# Altium footprint library TarabusLibrary.PcbLib: 591 footprints (part 20 of 37)
Each footprint in its own frame and in the unit in brackets; x right, y up, seen from the top. Pads: shape width x height; smd on the part's side, far side on the other; paste and mask are expansions set on the pad; w line width, h text height; cw(c..) or ccw(c..) is an arc to the next point about the centre after c.
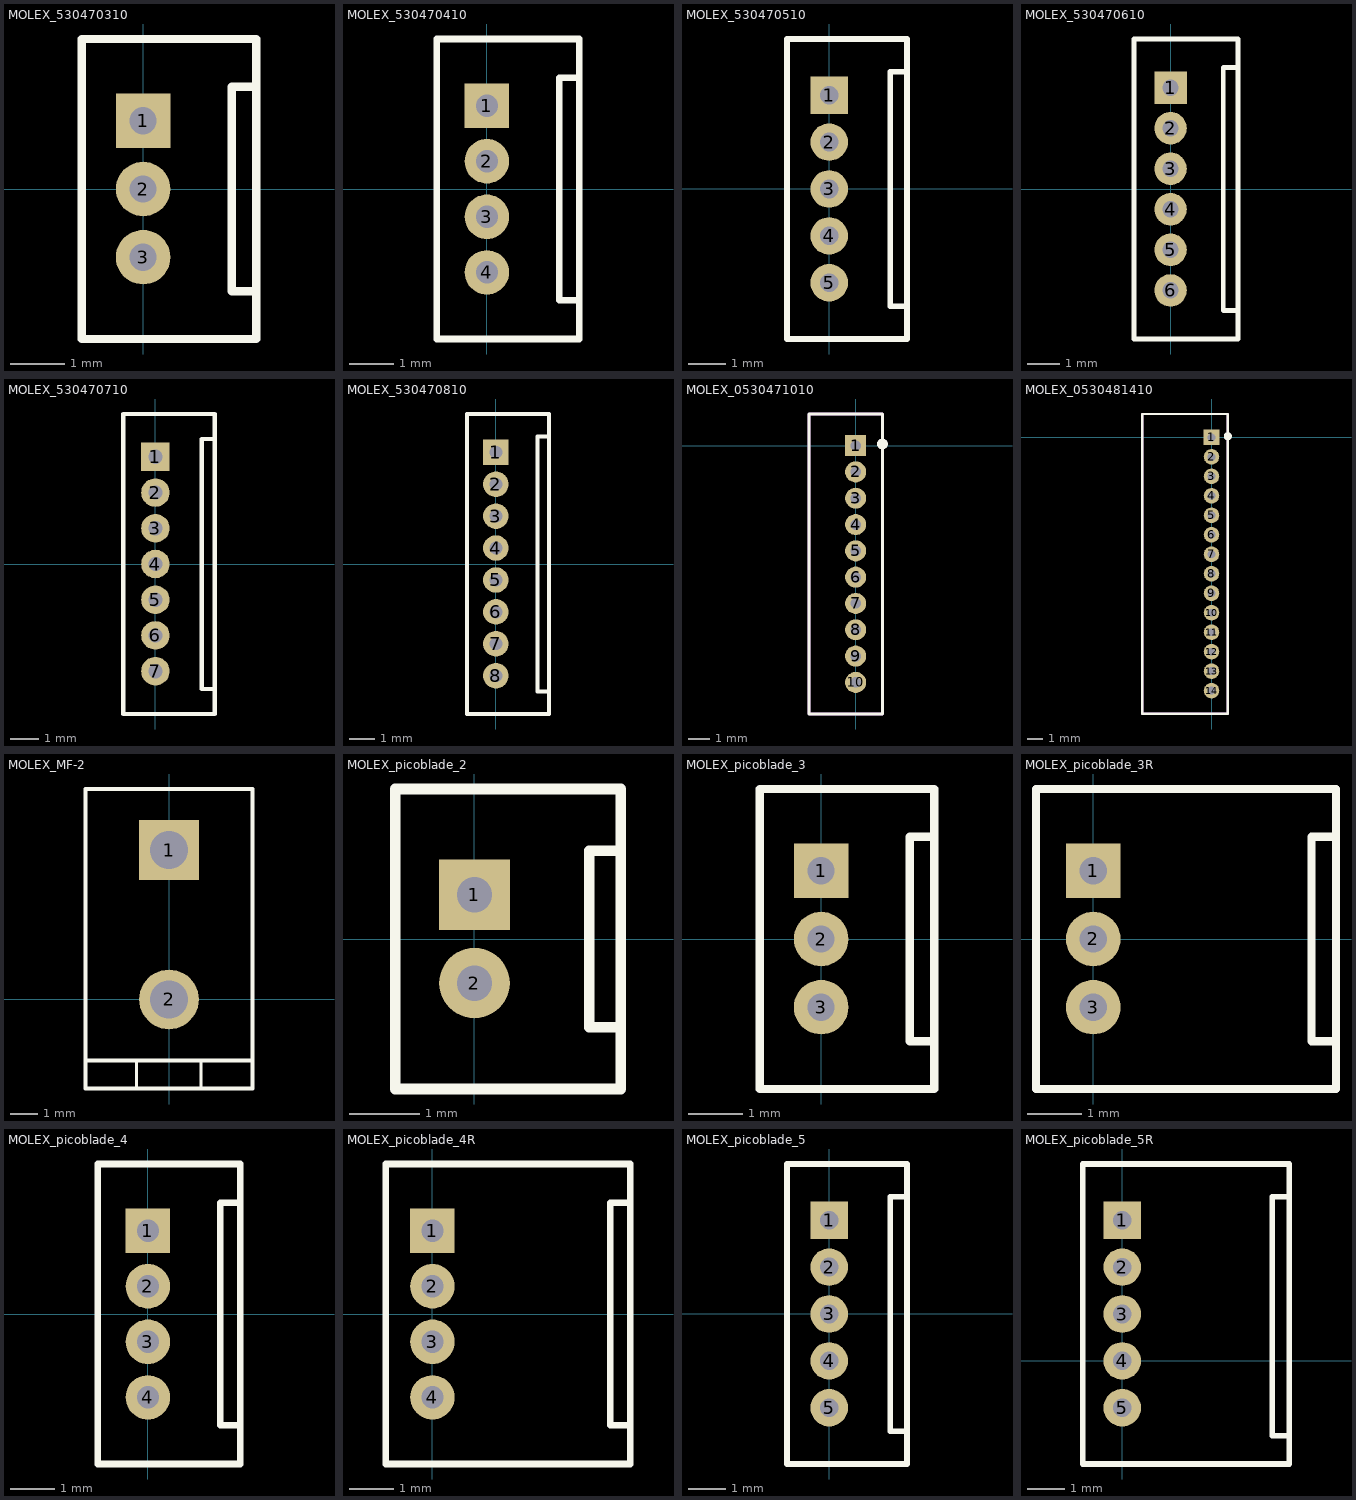
[diagram p19: the footprints below, top view; thin cyan lines are the x and y axes]

## MOLEX_530470310 [mm]
height 4.2
pads (3):
  rect 1x1 hole 0.5 mask+0.15: 1(0,1.25)
  round 1 hole 0.5 mask+0.15: 2(0,0) 3(0,-1.25)
Top Overlay:
  lines w0.15: 2.075,-1.875 1.625,-1.875 1.625,1.875 2.075,1.875 ; -1.125,-2.75 2.075,-2.75 2.075,2.75 -1.125,2.75 -1.125,-2.75
Mechanical 7:
  lines w0.1: 2.075,-1.875 1.625,-1.875 1.625,1.875 2.075,1.875 ; -1.125,-2.75 2.075,-2.75 2.075,2.75 -1.125,2.75 -1.125,-2.75
Mechanical 10:
  text ".Designator" at -0.78,3.68 h0.8
  text ".Comment" at -0.77,3.11 h0.6
3D body "530470310.STEP": height 4.22, standoff -2.18, extent -1.125,-2.75 2.075,2.75

## MOLEX_530470410 [mm]
height 4.2
pads (4):
  rect 1x1 hole 0.5 mask+0.15: 1(0,1.875)
  round 1 hole 0.5 mask+0.15: 2(0,0.625) 3(0,-0.625) 4(0,-1.875)
Top Overlay:
  lines w0.15: 2.075,-2.5 1.625,-2.5 1.625,2.5 2.075,2.5 ; -1.125,-3.375 -1.125,3.375 2.075,3.375 2.075,-3.375 -1.125,-3.375
Mechanical 7:
  lines w0.1: 2.075,-2.5 1.625,-2.5 1.625,2.5 2.075,2.5 ; -1.125,-3.375 -1.125,3.375 2.075,3.375 2.075,-3.375 -1.125,-3.375
Mechanical 10:
  text ".Comment" at -0.77,3.735 h0.6
  text ".Designator" at -0.78,4.305 h0.8
3D body "530470410.STEP": height 4.22, standoff -2.18, extent -1.125,-3.375 2.075,3.375

## MOLEX_530470510 [mm]
height 4.2
pads (5):
  rect 1x1 hole 0.5 mask+0.15: 1(0,2.5)
  round 1 hole 0.5 mask+0.15: 2(0,1.25) 3(0,0) 4(0,-1.25) 5(0,-2.5)
Top Overlay:
  lines w0.15: 2.075,-3.125 1.625,-3.125 1.625,3.125 2.075,3.125 ; -1.125,-4 -1.125,4 2.075,4 2.075,-4 -1.125,-4
Mechanical 7:
  lines w0.1: 2.075,-3.125 1.625,-3.125 1.625,3.125 2.075,3.125 ; -1.125,-4 -1.125,4 2.075,4 2.075,-4 -1.125,-4
Mechanical 10:
  text ".Comment" at -0.77,4.36 h0.6
  text ".Designator" at -0.78,4.93 h0.8
3D body "530470510.STEP": height 4.22, standoff -2.18, extent -1.125,-4 2.075,4

## MOLEX_530470610 [mm]
height 4.2
pads (6):
  rect 1x1 hole 0.5 mask+0.15: 1(0,3.125)
  round 1 hole 0.5 mask+0.15: 2(0,1.875) 3(0,0.625) 4(0,-0.625) 5(0,-1.875) 6(0,-3.125)
Top Overlay:
  lines w0.15: 2.075,-3.75 1.625,-3.75 1.625,3.75 2.075,3.75 ; -1.125,-4.625 -1.125,4.625 2.075,4.625 2.075,-4.625 -1.125,-4.625
Mechanical 7:
  lines w0.1: 2.075,-3.75 1.625,-3.75 1.625,3.75 2.075,3.75 ; -1.125,-4.625 -1.125,4.625 2.075,4.625 2.075,-4.625 -1.125,-4.625
Mechanical 10:
  text ".Comment" at -0.77,4.985 h0.6
  text ".Designator" at -0.78,5.555 h0.8
3D body "530470610.STEP": height 4.22, standoff -2.18, extent -1.125,-4.625 2.075,4.625

## MOLEX_530470710 [mm]
height 4.2
pads (7):
  rect 1x1 hole 0.5 mask+0.15: 1(0,3.75)
  round 1 hole 0.5 mask+0.15: 2(0,2.5) 3(0,1.25) 4(0,0) 5(0,-1.25) 6(0,-2.5) 7(0,-3.75)
Top Overlay:
  lines w0.15: 2.075,-4.375 1.625,-4.375 1.625,4.375 2.075,4.375 ; -1.125,-5.25 -1.125,5.25 2.075,5.25 2.075,-5.25 -1.125,-5.25
Mechanical 7:
  lines w0.1: 2.075,-4.375 1.625,-4.375 1.625,4.375 2.075,4.375 ; -1.125,-5.25 -1.125,5.25 2.075,5.25 2.075,-5.25 -1.125,-5.25
Mechanical 10:
  text ".Comment" at -0.77,5.61 h0.6
  text ".Designator" at -0.78,6.18 h0.8
3D body "530470710.STEP": height 4.22, standoff -2.18, extent -1.125,-5.25 2.075,5.25

## MOLEX_530470810 [mm]
height 4.2
pads (8):
  rect 1x1 hole 0.5 mask+0.15: 1(0,4.375)
  round 1 hole 0.5 mask+0.15: 2(0,3.125) 3(0,1.875) 4(0,0.625) 5(0,-0.625) 6(0,-1.875) 7(0,-3.125) 8(0,-4.375)
Top Overlay:
  lines w0.15: 2.075,-5 1.625,-5 1.625,5 2.075,5 ; -1.125,-5.875 2.075,-5.875 2.075,5.875 -1.125,5.875 -1.125,-5.875
Mechanical 7:
  lines w0.1: 2.075,-5 1.625,-5 1.625,5 2.075,5 ; -1.125,-5.875 2.075,-5.875 2.075,5.875 -1.125,5.875 -1.125,-5.875
Mechanical 10:
  text ".Designator" at -0.78,6.805 h0.8
  text ".Comment" at -0.77,6.235 h0.6
3D body "530470810.STEP": height 4.22, standoff -2.18, extent -1.125,-5.875 2.075,5.875

## MOLEX_0530471010 [mm]
pads (10):
  rect 1x1 hole 0.5 mask+0.15: 1(0,0)
  round 1 hole 0.5 mask+0.15: 2(0,-1.25) 3(0,-2.5) 4(0,-3.75) 5(0,-5) 6(0,-6.25) 7(0,-7.5) 8(0,-8.75) 9(0,-10) 10(0,-11.25)
Top Overlay:
  circle w0.254: c1.273,0.075 r0.127
  lines w0.15: -2.225,-12.75 1.275,-12.75 1.275,1.5 -2.225,1.5 -2.225,-12.75
Mechanical 7:
  lines w0.15: -2.225,-12.75 1.275,-12.75 1.275,1.5 -2.225,1.5 -2.225,-12.75
3D body "User Library-53047-1010.step": height 4.25, standoff -2.25, extent -2.225,-12.75 1.275,1.5

## MOLEX_0530481410 [mm]
pads (14):
  rect 1x1 hole 0.5 mask+0.15: 1(0,0)
  round 1 hole 0.5 mask+0.15: 2(0,-1.25) 3(0,-2.5) 4(0,-3.75) 5(0,-5) 6(0,-6.25) 7(0,-7.5) 8(0,-8.75) 9(0,-10) 10(0,-11.25) 11(0,-12.5) 12(0,-13.75) 13(0,-15) 14(0,-16.25)
Top Overlay:
  circle w0.254: c1.048,0.075 r0.127
  lines w0.15: -4.45,-17.725 -4.45,1.5 1.05,1.5 1.05,-17.75 1.025,-17.725 -4.45,-17.725
Mechanical 7:
  lines w0.15: -4.45,-17.725 1.025,-17.725 1.05,-17.75 1.05,1.5 -4.45,1.5 -4.45,-17.725
3D body "User Library-53048-1410.step": height 3.5, standoff -2.4, extent -4.45,-17.75 1.05,1.5

## MOLEX_MF-2 [mm]
pads (2):
  rect 2.2x2.2 hole 1.4: 1(0,5.5)
  round 2.2 hole 1.4: 2(0,0)
Top Overlay:
  lines w0.1: -1.2,-3.275 -1.2,-2.25 ; 1.175,-3.275 1.175,-2.25 ; 1.2,-3.275 1.225,-3.3
  lines w0.15: -3.075,-2.25 3.075,-2.25 ; -3.075,-3.275 -3.075,7.75 3.075,7.75 3.075,-3.275 -3.075,-3.275
Mechanical 7:
  lines w0.1: -3.075,-2.25 3.075,-2.25 3.075,7.75 -3.075,7.75 -3.075,-2.25
Mechanical 10:
  text ".Comment" at -1.27,4.41 h0.6
  text ".Designator" at -1.28,4.98 h0.8
3D body "039281023.stp": height 12.8, standoff -3.5, extent -3.1,-3.2 3.1,7.8

## MOLEX_picoblade_2 [mm]
height 4.2
pads (2):
  rect 1x1 hole 0.5 mask+0.15: 1(0,0.625)
  round 1 hole 0.5 mask+0.15: 2(0,-0.625)
Top Overlay:
  lines w0.15: 2.075,-1.25 1.625,-1.25 1.625,1.25 2.075,1.25 ; -1.125,-2.125 2.075,-2.125 2.075,2.125 -1.125,2.125 -1.125,-2.125
Mechanical 7:
  lines w0.1: 2.075,-1.25 1.625,-1.25 1.625,1.25 2.075,1.25 ; -1.125,-2.125 -1.125,2.125 2.075,2.125 2.075,-2.125 -1.125,-2.125
Mechanical 10:
  text ".Designator" at -0.78,3.055 h0.8
  text ".Comment" at -0.77,2.485 h0.6
3D body "530470210.STEP": height 4.22, standoff -2.18, extent -1.125,-2.125 2.075,2.125

## MOLEX_picoblade_3 [mm]
height 4.2
pads (3):
  rect 1x1 hole 0.5 mask+0.15: 1(0,1.25)
  round 1 hole 0.5 mask+0.15: 2(0,0) 3(0,-1.25)
Top Overlay:
  lines w0.15: 2.075,-1.875 1.625,-1.875 1.625,1.875 2.075,1.875 ; -1.125,-2.75 2.075,-2.75 2.075,2.75 -1.125,2.75 -1.125,-2.75
Mechanical 7:
  lines w0.1: 2.075,-1.875 1.625,-1.875 1.625,1.875 2.075,1.875 ; -1.125,-2.75 2.075,-2.75 2.075,2.75 -1.125,2.75 -1.125,-2.75
Mechanical 10:
  text ".Designator" at -0.78,3.68 h0.8
  text ".Comment" at -0.77,3.11 h0.6
3D body "530470310.STEP": height 4.22, standoff -2.18, extent -1.125,-2.75 2.075,2.75

## MOLEX_picoblade_3R [mm]
height 3.5
pads (3):
  rect 1x1 hole 0.5 mask+0.15: 1(0,1.25)
  round 1 hole 0.5 mask+0.15: 2(0,0) 3(0,-1.25)
Top Overlay:
  lines w0.15: 4.45,-1.875 4,-1.875 4,1.875 4.45,1.875 ; -1.05,-2.75 -1.05,2.75 4.45,2.75 4.45,-2.75 -1.05,-2.75
Mechanical 7:
  lines w0.1: 4.45,-1.875 4,-1.875 4,1.875 4.45,1.875 ; -1.05,-2.75 -1.05,2.75 4.45,2.75 4.45,-2.75 -1.05,-2.75
Mechanical 10:
  text ".Comment" at 0.605,3.16 h0.6
  text ".Designator" at 0.595,3.73 h0.8
3D body "530480310.STEP": height 3.51, standoff -2.29, extent -1.05,-2.75 4.45,2.75

## MOLEX_picoblade_4 [mm]
height 4.2
pads (4):
  rect 1x1 hole 0.5 mask+0.15: 1(0,1.875)
  round 1 hole 0.5 mask+0.15: 2(0,0.625) 3(0,-0.625) 4(0,-1.875)
Top Overlay:
  lines w0.15: 2.075,-2.5 1.625,-2.5 1.625,2.5 2.075,2.5 ; -1.125,-3.375 2.075,-3.375 2.075,3.375 -1.125,3.375 -1.125,-3.375
Mechanical 7:
  lines w0.1: 2.075,-2.5 1.625,-2.5 1.625,2.5 2.075,2.5 ; -1.125,-3.375 2.075,-3.375 2.075,3.375 -1.125,3.375 -1.125,-3.375
Mechanical 10:
  text ".Designator" at -0.78,4.305 h0.8
  text ".Comment" at -0.77,3.735 h0.6
3D body "530470410.STEP": height 4.22, standoff -2.18, extent -1.125,-3.375 2.075,3.375

## MOLEX_picoblade_4R [mm]
height 3.5
pads (4):
  rect 1x1 hole 0.5 mask+0.15: 1(0,1.875)
  round 1 hole 0.5 mask+0.15: 2(0,0.625) 3(0,-0.625) 4(0,-1.875)
Top Overlay:
  lines w0.15: 4.45,-2.5 4,-2.5 4,2.5 4.45,2.5 ; -1.05,-3.375 4.45,-3.375 4.45,3.375 -1.05,3.375 -1.05,-3.375
Mechanical 7:
  lines w0.1: 4.45,-2.5 4,-2.5 4,2.5 4.45,2.5 ; -1.05,-3.375 -1.05,3.375 4.45,3.375 4.45,-3.375 -1.05,-3.375
Mechanical 10:
  text ".Designator" at 0.595,4.355 h0.8
  text ".Comment" at 0.605,3.785 h0.6
3D body "530480410_grey.STEP": height 3.51, standoff -2.29, extent -1.05,-3.375 4.45,3.375

## MOLEX_picoblade_5 [mm]
height 4.2
pads (5):
  rect 1x1 hole 0.5 mask+0.15: 1(0,2.5)
  round 1 hole 0.5 mask+0.15: 2(0,1.25) 3(0,0) 4(0,-1.25) 5(0,-2.5)
Top Overlay:
  lines w0.15: 2.075,-3.125 1.625,-3.125 1.625,3.125 2.075,3.125 ; -1.125,-4 -1.125,4 2.075,4 2.075,-4 -1.125,-4
Mechanical 7:
  lines w0.1: 2.075,-3.125 1.625,-3.125 1.625,3.125 2.075,3.125 ; -1.125,-4 -1.125,4 2.075,4 2.075,-4 -1.125,-4
Mechanical 10:
  text ".Comment" at -0.77,4.36 h0.6
  text ".Designator" at -0.78,4.93 h0.8
3D body "530470510.STEP": height 4.22, standoff -2.18, extent -1.125,-4 2.075,4

## MOLEX_picoblade_5R [mm]
height 3.5
pads (5):
  rect 1x1 hole 0.5 mask+0.15: 1(0,3.75)
  round 1 hole 0.5 mask+0.15: 2(0,2.5) 3(0,1.25) 4(0,0) 5(0,-1.25)
Top Overlay:
  lines w0.15: 4.45,-2 4,-2 4,4.375 4.45,4.375 ; -1.05,-2.75 -1.05,5.25 4.45,5.25 4.45,-2.75 -1.05,-2.75
Mechanical 7:
  lines w0.1: 4.45,-2 4,-2 4,4.375 4.45,4.375 ; -1.05,-2.75 4.45,-2.75 4.45,5.25 -1.05,5.25 -1.05,-2.75
Mechanical 10:
  text ".Comment" at 0.605,5.66 h0.6
  text ".Designator" at 0.595,6.23 h0.8